# Altium footprint library Intelliclone.PcbLib: 372 footprints (part 11 of 24)
Each footprint in its own frame and in the unit in brackets; x right, y up, seen from the top. Pads: shape width x height; smd on the part's side, far side on the other; paste and mask are expansions set on the pad; w line width, h text height; cw(c..) or ccw(c..) is an arc to the next point about the centre after c.
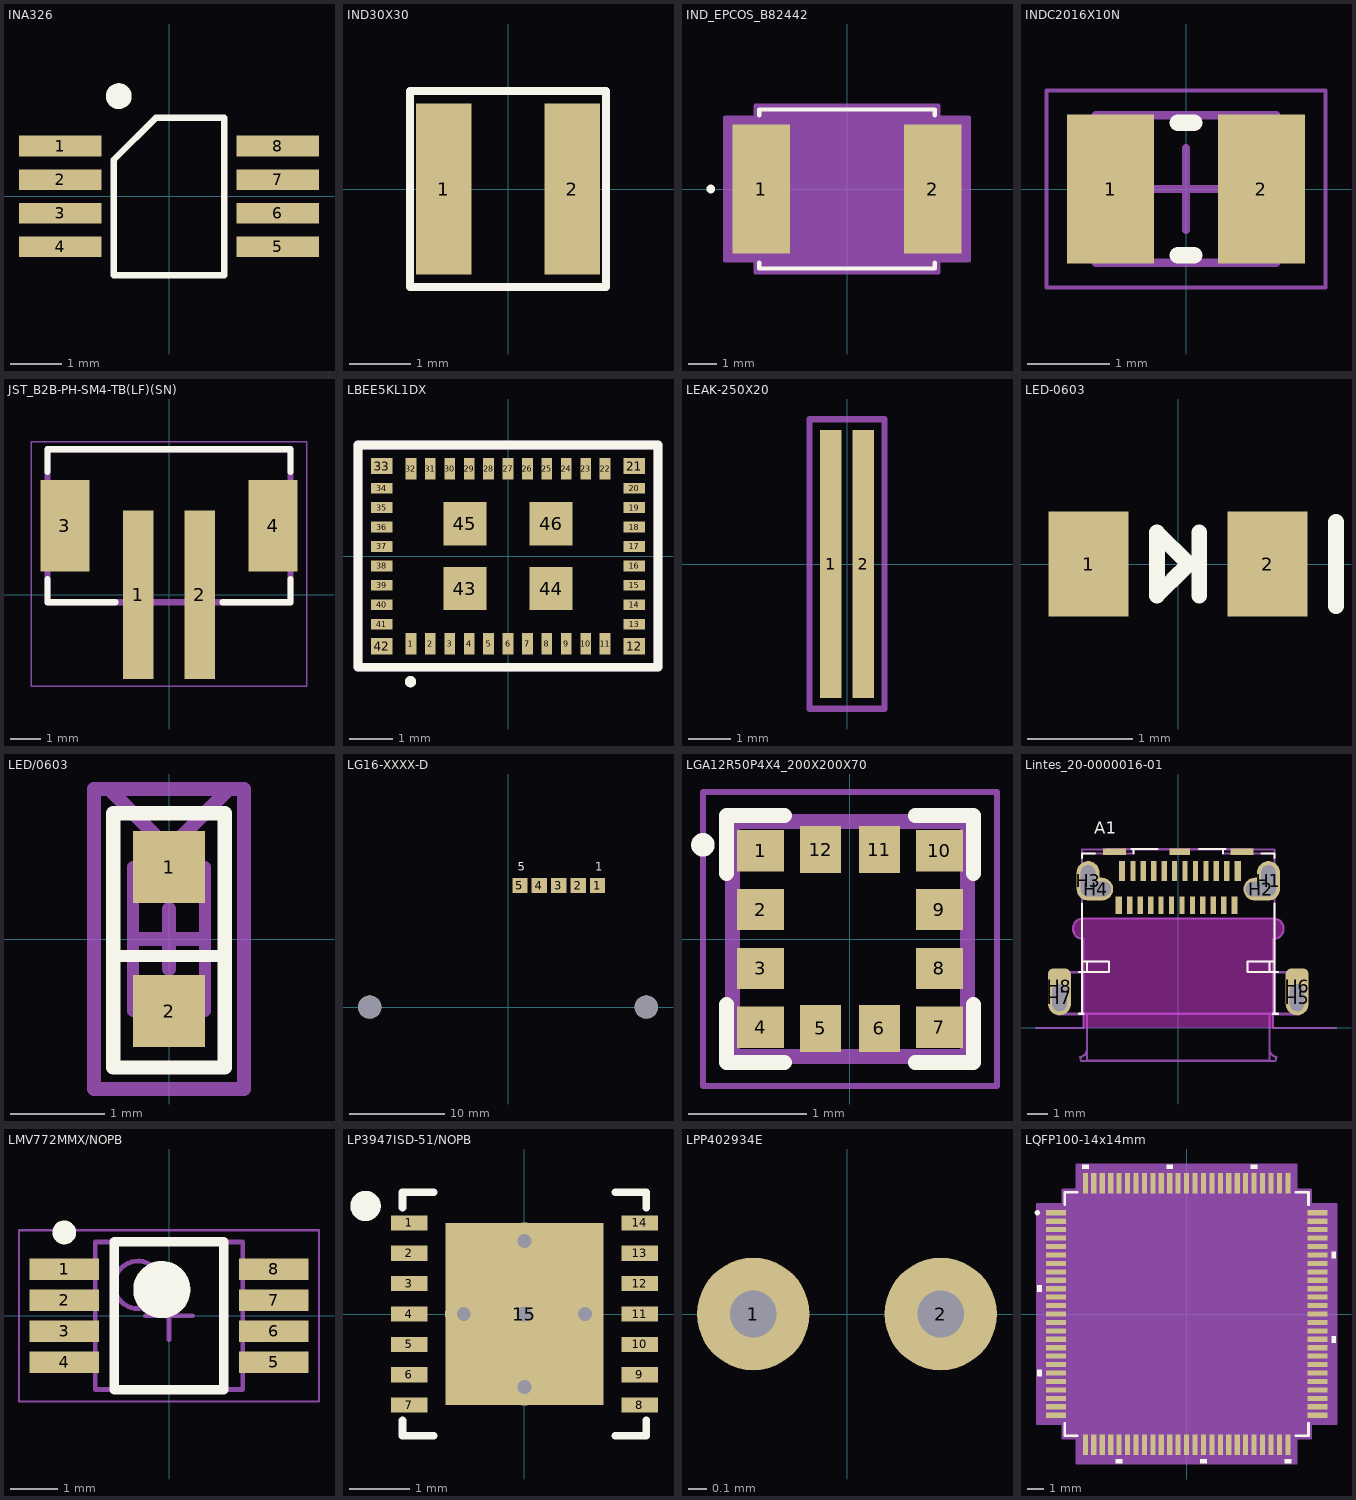
[diagram p10: the footprints below, top view; thin cyan lines are the x and y axes]

## INA326 [mil]
height 53.15
pads (8):
  rect 63x15.7 smd: 1(-82.7,38.4) 2(-82.7,12.8) 3(-82.7,-12.8) 4(-82.7,-38.4) 5(82.7,-38.4) 6(82.7,-12.8) 7(82.7,12.8) 8(82.7,38.4)
Top Overlay:
  circle w9.84: c-38.28,76.38 r4.92
  lines w5: -42,-60 -42,28 -10,60 42,60 42,-60 -42,-60
3D body: height 31, standoff 4, extent -61,-59 61,59

## IND30X30 [mm] "Inductor 3.0mm x 3.0mm"
height 1.2
pads (2):
  rect 0.9x2.8 smd: 1(-1.05,0) 2(1.05,0)
Top Overlay:
  lines w0.127: -1.6,-1.6 -1.6,1.6 1.6,1.6 1.6,-1.6 -1.6,-1.6
3D body: height 1.2, standoff 0.1, extent -1.5,-1.5 1.5,1.5

## IND_EPCOS_B82442 [mil]
pads (2):
  rect 79x177 smd paste+0 mask+0: 1(-118,0) 2(118,0)
Top Overlay:
  circle w6: c-187.5,0 r3
  lines w6: -121,-101.6 -121,-109.5 121,-109.5 121,-101.6 ; -121,101.6 -121,109.5 121,109.5 121,101.6
Mechanical 13:
  circle w0: c-113,0 r3
  lines w1: -116,-104.5 -116,104.5 116,104.5 116,-104.5 -116,-104.5
Mechanical 15:
  region: -126,-98.5 -167.5,-98.5 -167.5,98.5 -126,98.5 -126,114.5 126,114.5 126,98.5 167.5,98.5 167.5,-98.5 126,-98.5 126,-114.5 -126,-114.5
  lines w6: -167.5,-98.5 -126,-98.5 -126,-114.5 126,-114.5 126,-98.5 167.5,-98.5 167.5,98.5 126,98.5 126,114.5 -126,114.5 -126,98.5 -167.5,98.5 -167.5,-98.5
3D body "IND_EPCOS_B82442T.stp": height 209.02, standoff 0, extent -115.98,-104.6 115.99,104.61
3D body: height 10, standoff 0, extent 0,0 10,10

## INDC2016X10N [mm] "Chip Inductor, 2-Leads, Body 2.00x1.60mm, IPC Medium Density"
height 1
pads (2):
  rect 1.06x1.82 smd: 1(-0.92,0) 2(0.92,0)
Top Overlay:
  lines w0.2: -0.1,-0.81 0.1,-0.81 ; -0.1,0.81 0.1,0.81
Mechanical 13:
  lines w0.1: -1.1,-0.9 1.1,-0.9 1.1,0.9 -1.1,0.9 -1.1,-0.9
Mechanical 15:
  lines w0.05: -1.7,-1.2 1.7,-1.2 1.7,1.2 -1.7,1.2 -1.7,-1.2
  lines w0.1: -0.5,0 0.5,0 ; 0,-0.5 0,0.5
3D body "INDC2016X10N.step": height 1, standoff 0, extent -1.1,-0.9 1.1,0.9

## JST_B2B-PH-SM4-TB(LF)(SN) [mm]
pads (4):
  rect 1x5.5 smd: 1(-1,0) 2(1,0)
  rect 1.6x3 smd: 3(-3.4,2.25) 4(3.4,2.25)
Top Overlay:
  lines w0.2: -3.975,0.5 -3.975,-0.25 -1.75,-0.25 ; -3.975,4 -3.975,4.75 3.975,4.75 3.975,4 ; 1.75,-0.25 3.975,-0.25 3.975,0.5
Mechanical 4:
  lines w0.2: -3.975,-0.25 3.975,-0.25 ; -3.975,-0.25 -3.975,4.75 ; -3.975,-0.25 3.975,-0.25 ; -3.975,-0.25 -3.975,4.75 ; -3.975,4.75 3.975,4.75 ; -3.975,4.75 3.975,4.75 ; 3.975,-0.25 3.975,4.75 ; 3.975,-0.25 3.975,4.75
Mechanical 15:
  lines w0.05: -4.5,-3 4.5,-3 4.5,5 -4.5,5 -4.5,-3
3D body "B2B-PH-SM4-TB.STEP": height 6.6, standoff 0, extent -3.937,-2.413 4.013,4.587

## LBEE5KL1DX [mm]
pads (46):
  rect 0.25x0.5 smd: 1(-2.25,-2.025) 2(-1.8,-2.025) 3(-1.35,-2.025) 4(-0.9,-2.025) 5(-0.45,-2.025) 6(0,-2.025) 7(0.45,-2.025) 8(0.9,-2.025) 9(1.35,-2.025) 10(1.8,-2.025) 11(2.25,-2.025) 22(2.25,2.025) 23(1.8,2.025) 24(1.35,2.025) 25(0.9,2.025) 26(0.45,2.025) 27(0,2.025) 28(-0.45,2.025) 29(-0.9,2.025) 30(-1.35,2.025) 31(-1.8,2.025) 32(-2.25,2.025)
  rect 0.5x0.375 smd: 12(2.925,-2.087) 21(2.925,2.087) 33(-2.925,2.087) 42(-2.925,-2.087)
  rect 0.5x0.25 smd: 13(2.925,-1.575) 14(2.925,-1.125) 15(2.925,-0.675) 16(2.925,-0.225) 17(2.925,0.225) 18(2.925,0.675) 19(2.925,1.125) 20(2.925,1.575) 34(-2.925,1.575) 35(-2.925,1.125) 36(-2.925,0.675) 37(-2.925,0.225) 38(-2.925,-0.225) 39(-2.925,-0.675) 40(-2.925,-1.125) 41(-2.925,-1.575)
  rect 1x1 smd: 43(-1,-0.75) 44(1,-0.75) 45(-1,0.75) 46(1,0.75)
Top Overlay:
  circle w0.2: c-2.259,-2.906 r0.031
  lines w0.2: -3.475,-2.575 3.475,-2.575 3.475,2.575 -3.475,2.575 -3.475,-2.575
Mechanical 15:
  lines w0.2: -3.475,-2.575 -3.475,2.575 3.475,2.575 3.475,-2.575 -3.475,-2.575
3D body: height 1.1, standoff 0, extent -3.28,-2.38 3.28,2.38

## LEAK-250X20 [mil]
pads (2):
  rect 20x250 smd: 1(-15,0) 2(15,0)
Mechanical 15:
  lines w6: -35,-135 -35,135 35,135 35,-135 -35,-135

## LED-0603 [mm] "0603 Diode"
pads (2):
  rect 0.762x1 smd: 1(-0.85,0) 2(0.85,0)
Top Overlay:
  lines w0.15: -0.055,-0.155 0.1,0 ; 0.2,-0.3 0.2,0.3 ; 1.5,-0.4 1.5,0.4 ; 0.1,0 -0.2,-0.3 -0.2,0.3 0.1,0
3D body: height 0.51, standoff 0.1, extent -1.245,-0.483 1.245,0.483

## LED/0603 [mil]
pads (2):
  rect 30x30 smd: 1(0,30) 2(0,-30)
Top Overlay:
  lines w5: -23.23,-7 23.23,-7
  lines w6: -23.23,-53.54 23.23,-53.54 23.23,52.36 -23.23,52.36 -23.23,-53.54
Mechanical 13:
  lines w5: -15,-30 -15,30 15,30 15,-30 -15,-30
Mechanical 15:
  lines w6: -25,62.5 0,37.5 25,62.5 ; -12.5,0 12.5,0 ; 0,-12.5 0,12.5 ; -31.25,-62.5 31.25,-62.5 31.25,62.5 -31.25,62.5 -31.25,-62.5
3D body: height 31.5, standoff 0, extent -15,-30 15,30

## LG16-XXXX-D [mil] "LG 16 Flow Sensor Module Mount"
pads (7):
  rect 63x63 smd: 1(369.37,501.5) 2(289.37,501.5) 3(209.37,501.5) 4(129.37,501.5) 5(49.37,501.5)
  round 96 hole 96 unplated paste+0: ""(-570.87,0) ""(570.87,0)
Top Overlay:
  text "5" at 40,550 h60
  text "1" at 360,550 h60
3D body: height 540, standoff 180, extent -1105,-525 1105,-45
3D body: height 520, standoff 343, extent -690,-45 690,340
3D body: height 540, standoff 180, extent -1250,-525 -1105.5,-150
3D body: height 540, standoff 180, extent 1106,-525 1260,-150

## LGA12R50P4X4_200X200X70 [mm]
pads (12):
  rect 0.4x0.35 smd: 1(-0.76,0.75) 2(-0.76,0.25) 3(-0.76,-0.25) 4(-0.76,-0.75) 7(0.76,-0.75) 8(0.76,-0.25) 9(0.76,0.25) 10(0.76,0.75)
  rect 0.35x0.4 smd: 5(-0.25,-0.76) 6(0.25,-0.76) 11(0.25,0.76) 12(-0.25,0.76)
Top Overlay:
  circle w0.1: c-1.25,0.8 r0.05
  lines w0.127: -1.05,-0.555 -1.05,-1.05 -0.555,-1.05 ; -1.05,0.555 -1.05,1.05 -0.555,1.05 ; 0.555,-1.05 1.05,-1.05 1.05,-0.555 ; 0.555,1.05 1.05,1.05 1.05,0.555
Mechanical 4:
  circle w0.1: c-0.75,0.75 r0.05
  circle w0.1: c-0.75,0.75 r0.05
  lines w0.127: -1,-1 -1,1 ; -1,-1 1,-1 ; -1,-1 -1,1 ; -1,-1 1,-1 ; -1,1 1,1 ; -1,1 1,1 ; 1,-1 1,1 ; 1,-1 1,1
Mechanical 15:
  lines w0.05: -1.25,-1.25 -1.25,1.25 1.25,1.25 1.25,-1.25 -1.25,-1.25
3D body: height 0.8, standoff 0.1, extent -1.05,-1.05 1.05,1.05

## Lintes_20-0000016-01 [mm] "Connector, Receptacle, USB Type C, SMT"
height 2.96
pads (35):
  rect 1.1x0.3 smd: 1(3.05,8.44) 3(-3.05,8.44)
  rect 1x0.3 smd: 2(0.07,8.44)
  rect 0.3x0.95 smd: A1(-2.7,7.525) A12(2.85,7.525)
  rect 0.25x0.95 smd: A2(-2.175,7.525) A3(-1.675,7.525) A4(-1.175,7.525) A5(-0.675,7.525) A6(-0.175,7.525) A7(0.325,7.525) A8(0.825,7.525) A9(1.325,7.525) A10(1.825,7.525) A11(2.325,7.525)
  rect 0.3x0.85 smd: B1(2.7,5.875) B12(-2.85,5.875)
  rect 0.25x0.85 smd: B2(2.175,5.875) B3(1.675,5.875) B4(1.175,5.875) B5(0.675,5.875) B6(0.175,5.875) B7(-0.325,5.875) B8(-0.825,5.875) B9(-1.325,5.875) B10(-1.825,5.875) B11(-2.325,5.875)
  oval 1.1x1.9 hole 0.7 slot 1.5 at 90 deg: H1(4.323,7.05) H3(-4.323,7.05)
  oval 1.65x1.1 hole 0.7 slot 1.45 at 0 deg: H2(3.949,6.65) H4(-3.949,6.65)
  oval 1.1x1.7 hole 0.7 slot 1.3 at 90 deg: H5(5.7,1.45) H7(-5.7,1.45)
  rrect50% 1.1x1.7 all layers, no hole: H6(5.7,2) H8(-5.7,2)
Top Overlay:
  lines w0.1: -4.77,0.675 -4.62,0.675 ; -4.77,2.675 -4.62,2.675 ; -4.62,2.65 -4.62,5.95 ; -4.62,3.175 -3.32,3.175 -3.32,2.675 -4.62,2.675 ; -4.62,8.15 -4.62,8.365 -4,8.365 ; -4.55,0.675 -4.62,0.675 ; -4.37,2.675 -4.37,3.175 ; -2.252,8.575 -2.14,8.575 ; -2.14,8.365 -2.14,8.575 ; -1,8.575 -2.14,8.575 ; 1,8.575 2.14,8.575 ; 2.14,8.365 2.14,8.575 ; 2.252,8.575 2.14,8.575 ; 4,8.365 4.62,8.365 4.62,8.15 ; 4.37,2.675 4.37,3.175 ; 4.55,0.675 4.62,0.675 ; 4.62,2.65 4.62,5.95 ; 4.62,3.175 3.32,3.175 3.32,2.675 4.62,2.675 ; 4.77,0.675 4.62,0.675 ; 4.77,2.675 4.62,2.675 ; -4.62,0.675 -4.62,2.675 ; 4.62,0.675 4.62,2.675
  text "A1" at -4.039,9.119 h1
Keep-Out Layer:
  board cut-out: -4.55,0 -4.55,4.25 -4.649,4.25 -4.833,4.326 -4.974,4.467 -5.05,4.651 -5.05,4.849 -4.974,5.033 -4.833,5.174 -4.649,5.25 -4.55,5.25 4.55,5.25 4.649,5.25 4.833,5.174 4.974,5.033 5.05,4.849 5.05,4.651 4.974,4.467 4.833,4.326 4.649,4.25 4.55,4.25 4.55,0
Mechanical 1:
  lines w0.1: -6.823,0 -4.55,0 -4.55,4.25 cw(c-4.55,4.75) -4.55,5.25 4.55,5.25 cw(c4.55,4.75) 4.55,4.25 4.55,0 7.562,0
  text "Board Edge" at 5.2,-0.725 h0.5
Mechanical 5:
  lines w0.1: -4.37,0.675 -4.37,-1.573 -3.17,-1.573 3.17,-1.573 4.37,-1.573 4.37,0.675 ; -4.37,2.675 -4.37,3.175 ; -3.374,8.365 -3.374,8.375 -3.461,8.375 -3.5,8.375 -3.5,8.575 -3.461,8.575 -3.124,8.575 -3.051,8.575 -2.252,8.575 -2.14,8.575 ; 3.374,8.365 3.374,8.375 3.461,8.375 3.5,8.375 3.5,8.575 3.461,8.575 3.124,8.575 3.051,8.575 2.252,8.575 2.14,8.575 ; 4.37,2.675 4.37,3.175 ; 4.62,2.65 4.62,8.55 0,8.55 -4.62,8.55 -4.62,2.65 -5.8,2.65 -5.8,0.65 -4.37,0.65 -4.37,-1.008 cw(c-4.77,-1.008) -4.703,-1.403 -4.67,-1.6 -3.17,-1.6 0,-1.6 3.17,-1.6 4.67,-1.6 4.703,-1.403 cw(c4.77,-1.008) 4.37,-1.008 4.37,0.65 5.8,0.65 ; 4.636,2.65 5.816,2.65 5.816,0.65 ; -4.62,0.675 -4.77,0.675 -5.5,0.675 -5.8,0.675 -5.8,2.675 -5.5,2.675 -4.77,2.675 -4.62,2.675 ; -4.62,0.675 -3.32,0.675 3.32,0.675 4.62,0.675 ; -4.62,0.675 -4.62,2.675 ; -4.62,2.675 -3.32,2.675 -3.32,3.175 -4.62,3.175 -4.62,8.365 -3.32,8.365 -2.14,8.365 -2.14,8.575 ; -2.14,8.575 2.14,8.575 ; 2.14,8.575 2.14,8.365 3.32,8.365 4.62,8.365 4.62,3.175 3.32,3.175 3.32,2.675 4.62,2.675 ; 4.62,0.675 4.62,2.675 ; 4.62,0.675 4.77,0.675 5.5,0.675 5.8,0.675 5.8,2.675 5.5,2.675 4.77,2.675 4.62,2.675
  text ".Designator" at -2.225,3.95 h1.02
3D body "Lintes_20-0000016-01.stp": height 2.44, standoff -0.98, extent -5.8,-1.563 5.8,8.585

## LMV772MMX/NOPB [mm] "TSOP, 8-Leads, Body 3.00x3.00mm, Pitch 0.65mm, IPC Medium Density"
height 1.1
pads (8):
  rect 1.45x0.45 smd: 1(-2.2,0.975) 2(-2.2,0.325) 3(-2.2,-0.325) 4(-2.2,-0.975) 5(2.2,-0.975) 6(2.2,-0.325) 7(2.2,0.325) 8(2.2,0.975)
Top Overlay:
  circle w0.6: c-0.15,0.55 r0.3
  circle w0.25: c-2.2,1.75 r0.125
  lines w0.2: -1.15,-1.55 1.15,-1.55 1.15,1.55 -1.15,1.55 -1.15,-1.55
Mechanical 13:
  circle w0.1: c-0.65,0.65 r0.5
  lines w0.1: -1.55,-1.55 1.55,-1.55 1.55,1.55 -1.55,1.55 -1.55,-1.55
Mechanical 15:
  lines w0.05: -3.15,-1.8 3.15,-1.8 3.15,1.8 -3.15,1.8 -3.15,-1.8
  lines w0.1: -0.5,0 0.5,0 ; 0,-0.5 0,0.5
3D body "TSOP65P490X110-8N.step": height 1.1, standoff 0, extent -2.45,-1.55 2.45,1.55

## LP3947ISD-51/NOPB [mm]
pads (15):
  rect 0.6x0.25 smd: 1(-1.9,1.5) 2(-1.9,1) 3(-1.9,0.5) 4(-1.9,0) 5(-1.9,-0.5) 6(-1.9,-1) 7(-1.9,-1.5) 8(1.9,-1.5) 9(1.9,-1) 10(1.9,-0.5) 11(1.9,0) 12(1.9,0.5) 13(1.9,1) 14(1.9,1.5)
  rect 2.6x3 smd: 15(0,0)
via 0,1.2 diameter 0.61 hole 0.229
via 0,-1.2 diameter 0.61 hole 0.229
via -1,0 diameter 0.61 hole 0.229
via 1,0 diameter 0.61 hole 0.229
via 0,0 diameter 0.61 hole 0.254
Top Overlay:
  circle w0.25: c-2.616,1.78 r0.125
  lines w0.127: -2.007,-1.753 -2.007,-2.007 -1.499,-2.007 ; -2.007,1.753 -2.007,2.007 -1.499,2.007 ; 1.499,-2.007 2.007,-2.007 2.007,-1.753 ; 1.499,2.007 2.007,2.007 2.007,1.753
3D body: height 1.02, standoff 0.1, extent -2.007,-2.007 2.007,2.007

## LPP402934E [mil] "ION Battery"
height 100
pads (2):
  round 24 hole 10: 1(-20,0) 2(20,0)

## LQFP100-14x14mm [mil]
pads (100):
  rect 47x12 smd: 1(-305.12,236.22) 2(-305.12,216.54) 3(-305.12,196.85) 4(-305.12,177.17) 5(-305.12,157.48) 6(-305.12,137.8) 7(-305.12,118.11) 8(-305.12,98.43) 9(-305.12,78.74) 10(-305.12,59.06) 11(-305.12,39.37) 12(-305.12,19.69) 13(-305.12,0) 14(-305.12,-19.68) 15(-305.12,-39.37) 16(-305.12,-59.06) 17(-305.12,-78.74) 18(-305.12,-98.43) 19(-305.12,-118.11) 20(-305.12,-137.8) 21(-305.12,-157.48) 22(-305.12,-177.17) 23(-305.12,-196.85) 24(-305.12,-216.54) 25(-305.12,-236.22) 51(305.12,-236.22) 52(305.12,-216.54) 53(305.12,-196.85) 54(305.12,-177.17) 55(305.12,-157.48) 56(305.12,-137.8) 57(305.12,-118.11) 58(305.12,-98.43) 59(305.12,-78.74) 60(305.12,-59.06) 61(305.12,-39.37) 62(305.12,-19.68) 63(305.12,0) 64(305.12,19.68) 65(305.12,39.37) 66(305.12,59.06) 67(305.12,78.74) 68(305.12,98.43) 69(305.12,118.11) 70(305.12,137.8) 71(305.12,157.48) 72(305.12,177.17) 73(305.12,196.85) 74(305.12,216.54) 75(305.12,236.22)
  rect 12x47 smd: 26(-236.22,-305.12) 27(-216.54,-305.12) 28(-196.85,-305.12) 29(-177.17,-305.12) 30(-157.48,-305.12) 31(-137.8,-305.12) 32(-118.11,-305.12) 33(-98.43,-305.12) 34(-78.74,-305.12) 35(-59.06,-305.12) 36(-39.37,-305.12) 37(-19.68,-305.12) 38(0,-305.12) 39(19.68,-305.12) 40(39.37,-305.12) 41(59.06,-305.12) 42(78.74,-305.12) 43(98.43,-305.12) 44(118.11,-305.12) 45(137.8,-305.12) 46(157.48,-305.12) 47(177.17,-305.12) 48(196.85,-305.12) 49(216.54,-305.12) 50(236.22,-305.12) 76(236.22,305.12) 77(216.54,305.12) 78(196.85,305.12) 79(177.17,305.12) 80(157.48,305.12) 81(137.8,305.12) 82(118.11,305.12) 83(98.43,305.12) 84(78.74,305.12) 85(59.06,305.12) 86(39.37,305.12) 87(19.68,305.12) 88(0,305.12) 89(-19.68,305.12) 90(-39.37,305.12) 91(-59.06,305.12) 92(-78.74,305.12) 93(-98.43,305.12) 94(-118.11,305.12) 95(-137.8,305.12) 96(-157.48,305.12) 97(-177.17,305.12) 98(-196.85,305.12) 99(-216.54,305.12) 100(-236.22,305.12)
Top Overlay:
  circle w6: c-348.46,236.22 r3
  region: -338.62,66.56 -348.62,66.56 -348.62,51.56 -338.62,51.56
  region: -338.62,-130.3 -348.62,-130.3 -348.62,-145.3 -338.62,-145.3
  region: -149.98,-338.62 -164.98,-338.62 -164.98,-348.62 -149.98,-348.62
  region: 46.87,-338.62 31.87,-338.62 31.87,-348.62 46.87,-348.62
  region: 243.72,-338.62 228.72,-338.62 228.72,-348.62 243.72,-348.62
  region: 338.62,-51.56 348.62,-51.56 348.62,-66.56 338.62,-66.56
  region: 338.62,145.3 348.62,145.3 348.62,130.3 338.62,130.3
  region: 164.98,338.62 149.98,338.62 149.98,348.62 164.98,348.62
  region: -31.87,338.62 -46.87,338.62 -46.87,348.62 -31.87,348.62
  region: -228.72,338.62 -243.72,338.62 -243.72,348.62 -228.72,348.62
  lines w6: -284.5,-255.32 -284.5,-284.5 -255.32,-284.5 ; -284.5,255.32 -284.5,284.5 -255.32,284.5 ; 255.32,-284.5 284.5,-284.5 284.5,-255.32 ; 255.32,284.5 284.5,284.5 284.5,255.32
Mechanical 13:
  circle w0: c-256.62,236.22 r3
  lines w1: -279.5,229.5 -229.5,279.5 ; -279.5,-279.5 279.5,-279.5 279.5,279.5 -279.5,279.5 -279.5,-279.5
Mechanical 15:
  region: -256.22,-289.5 -289.5,-289.5 -289.5,-256.22 -348.62,-256.22 -348.62,256.22 -289.5,256.22 -289.5,289.5 -256.22,289.5 -256.22,348.62 256.22,348.62 256.22,289.5 289.5,289.5 289.5,256.22 348.62,256.22 348.62,-256.22 289.5,-256.22 289.5,-289.5 256.22,-289.5 256.22,-348.62 -256.22,-348.62
  lines w6: -348.62,-256.22 -289.5,-256.22 -289.5,-289.5 -256.22,-289.5 -256.22,-348.62 256.22,-348.62 256.22,-289.5 289.5,-289.5 289.5,-256.22 348.62,-256.22 348.62,256.22 289.5,256.22 289.5,289.5 256.22,289.5 256.22,348.62 -256.22,348.62 -256.22,289.5 -289.5,289.5 -289.5,256.22 -348.62,256.22 -348.62,-256.22
3D body: height 10, standoff 0, extent 0,0 10,10
3D body "LQFP100-14x14mm.step": height 63.11, standoff 0, extent -314.84,-314.84 314.84,314.84